# Altium footprint library 04.连接器件.pcb.PCBLIB: 363 footprints (part 22 of 23)
Each footprint in its own frame and in the unit in brackets; x right, y up, seen from the top. Pads: shape width x height; smd on the part's side, far side on the other; paste and mask are expansions set on the pad; w line width, h text height; cw(c..) or ccw(c..) is an arc to the next point about the centre after c.
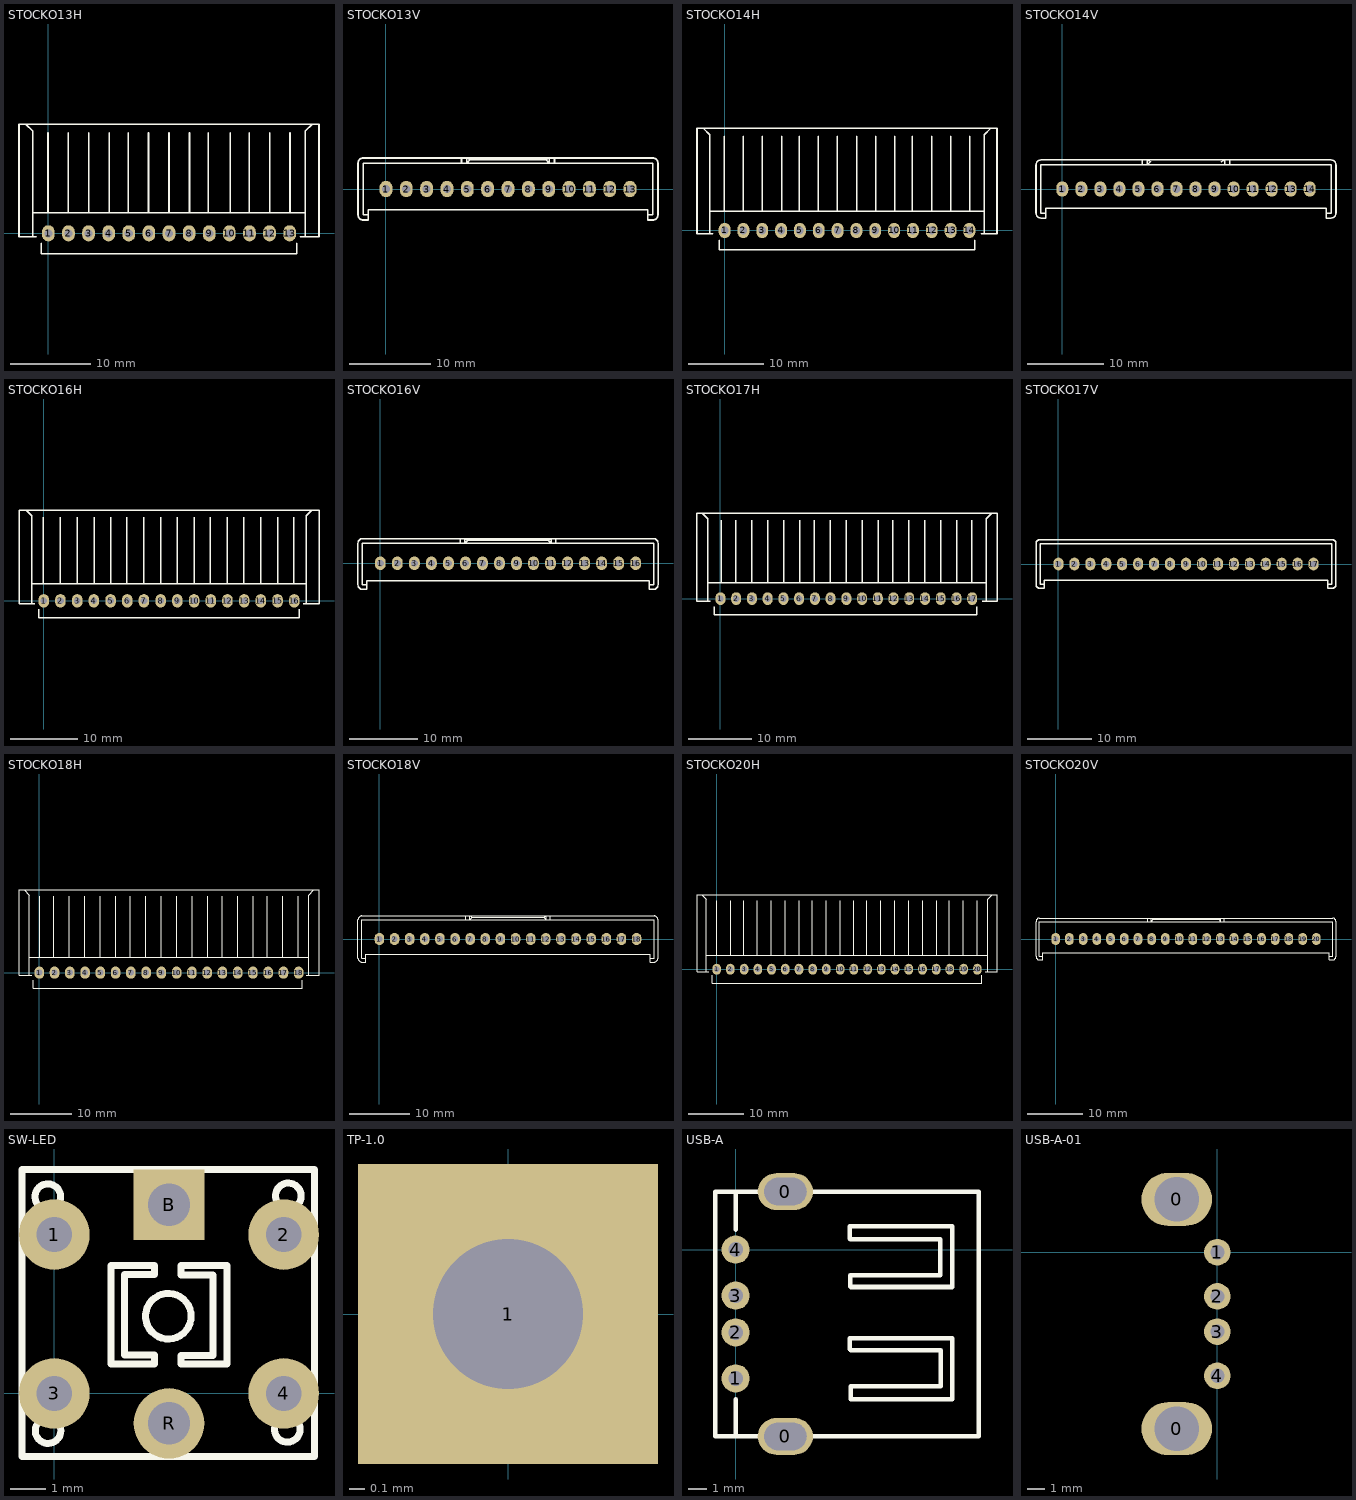
[diagram p21: the footprints below, top view; thin cyan lines are the x and y axes]

## STOCKO13H [mm]
pads (13):
  oval 1.575x2 hole 1: 1(0,0) 2(2.498,0) 3(4.995,0) 4(7.493,0) 5(9.991,0) 6(12.488,0) 7(14.986,0) 8(17.484,0) 9(19.981,0) 10(22.479,0) 11(24.977,0) 12(27.474,0) 13(29.972,0)
TopOverlay:
  lines w0.2: -2.794,13.547 -1.947,12.7 -1.947,-0.423 ; -1.947,2.54 31.919,2.54 ; -1.524,-0.423 -3.641,-0.423 -3.641,13.547 33.613,13.547 33.613,-0.423 31.284,-0.423 ; -0.889,-1.27 -0.889,-2.54 30.861,-2.54 30.861,-1.27 ; -0.042,2.54 -0.042,12.488 ; 2.498,2.54 2.498,12.488 ; 5.038,2.54 5.038,12.488 ; 7.578,2.54 7.578,12.488 ; 9.906,2.54 9.906,12.488 ; 12.446,2.54 12.446,12.488 ; 14.986,2.54 14.986,12.488 ; 17.526,2.54 17.526,12.488 ; 19.854,2.54 19.854,12.488 ; 22.606,2.54 22.606,12.488 ; 24.934,2.54 24.934,12.488 ; 27.474,2.54 27.474,12.488 ; 30.014,2.54 30.014,12.488 ; 31.919,-0.423 31.919,12.7 32.766,13.547

## STOCKO13V [mm]
pads (13):
  oval 1.575x2 hole 1: 1(0,0) 2(2.498,0) 3(4.995,0) 4(7.493,0) 5(9.991,0) 6(12.488,0) 7(14.986,0) 8(17.484,0) 9(19.981,0) 10(22.479,0) 11(24.977,0) 12(27.474,0) 13(29.972,0)
TopOverlay:
  lines w0.2: -2.159,-3.175 -2.794,-3.175 -2.794,3.175 32.766,3.175 32.766,-3.175 32.131,-3.175 ; 9.271,3.175 9.271,3.81 ; 20.701,3.175 20.701,3.81 ; 10.329,3.598 9.906,3.175 9.906,3.81 10.329,3.598 ; 10.329,3.598 19.643,3.598 ; 19.643,3.598 20.066,3.175 20.066,3.81 19.643,3.598 ; -3.429,-3.175 ccw(c-2.794,-3.175) -2.794,-3.81 -2.159,-3.81 -2.159,-2.54 32.131,-2.54 32.131,-3.81 32.766,-3.81 ccw(c32.766,-3.175) 33.401,-3.175 33.401,3.175 ccw(c32.766,3.175) 32.766,3.81 -2.794,3.81 ccw(c-2.794,3.175) -3.429,3.175 -3.429,-3.175

## STOCKO14H [mm]
pads (14):
  oval 1.575x2 hole 1: 1(0,0) 2(2.498,0) 3(4.995,0) 4(7.493,0) 5(9.991,0) 6(12.488,0) 7(14.986,0) 8(17.484,0) 9(19.981,0) 10(22.479,0) 11(24.977,0) 12(27.474,0) 13(29.972,0) 14(32.47,0)
TopOverlay:
  lines w0.2: -2.815,13.547 -1.968,12.7 -1.968,-0.423 ; -1.968,2.54 34.438,2.54 ; -1.545,-0.423 -3.662,-0.423 -3.662,13.547 36.131,13.547 36.131,-0.423 34.015,-0.423 ; -0.699,-1.27 -0.699,-2.54 33.168,-2.54 33.168,-1.27 ; -0.064,2.54 -0.064,12.488 ; 2.476,2.54 2.476,12.488 ; 5.016,2.54 5.016,12.488 ; 7.556,2.54 7.556,12.488 ; 9.885,2.54 9.885,12.488 ; 12.425,2.54 12.425,12.488 ; 14.965,2.54 14.965,12.488 ; 17.505,2.54 17.505,12.488 ; 20.045,2.54 20.045,12.488 ; 22.585,2.54 22.585,12.488 ; 24.913,2.54 24.913,12.488 ; 27.453,2.54 27.453,12.488 ; 29.993,2.54 29.993,12.488 ; 32.533,2.54 32.533,12.488 ; 34.438,-0.423 34.438,12.7 35.285,13.547

## STOCKO14V [mm]
pads (14):
  oval 1.575x2 hole 1: 1(0,0) 2(2.498,0) 3(4.995,0) 4(7.493,0) 5(9.991,0) 6(12.488,0) 7(14.986,0) 8(17.484,0) 9(19.981,0) 10(22.479,0) 11(24.977,0) 12(27.474,0) 13(29.972,0) 14(32.47,0)
TopOverlay:
  lines w0.2: -2.18,-3.175 -2.815,-3.175 -2.815,3.175 35.285,3.175 35.285,-3.175 34.65,-3.175 ; 10.52,3.175 10.52,3.81 ; 20.891,3.598 21.315,3.81 21.315,3.175 ; 21.95,3.175 21.95,3.81 ; -3.45,-3.175 ccw(c-2.815,-3.175) -2.815,-3.81 -2.18,-3.81 -2.18,-2.54 34.65,-2.54 34.65,-3.81 35.285,-3.81 ccw(c35.285,-3.175) 35.92,-3.175 35.92,3.175 ccw(c35.285,3.175) 35.285,3.81 -2.815,3.81 ccw(c-2.815,3.175) -3.45,3.175 -3.45,-3.175 ; 11.155,3.175 11.578,3.598 11.155,3.81 11.155,3.175

## STOCKO16H [mm]
pads (16):
  oval 1.575x2 hole 1: 1(0,0) 2(2.498,0) 3(4.995,0) 4(7.493,0) 5(9.991,0) 6(12.488,0) 7(14.986,0) 8(17.484,0) 9(19.981,0) 10(22.479,0) 11(24.977,0) 12(27.474,0) 13(29.972,0) 14(32.47,0) 15(34.967,0) 16(37.465,0)
TopOverlay:
  lines w0.2: -2.646,13.547 -1.799,12.7 -1.799,-0.423 ; -1.799,2.54 39.264,2.54 ; -1.376,-0.423 -3.704,-0.423 -3.704,13.547 41.169,13.547 41.169,-0.423 38.841,-0.423 ; -0.741,-1.27 -0.741,-2.54 38.206,-2.54 38.206,-1.27 ; -0.106,2.54 -0.106,12.488 ; 2.434,2.54 2.434,12.488 ; 4.974,2.54 4.974,12.488 ; 7.514,2.54 7.514,12.488 ; 10.054,2.54 10.054,12.488 ; 12.383,2.54 12.383,12.488 ; 14.922,2.54 14.922,12.488 ; 17.462,2.54 17.462,12.488 ; 20.002,2.54 20.002,12.488 ; 22.543,2.54 22.543,12.488 ; 24.871,2.54 24.871,12.488 ; 27.411,2.54 27.411,12.488 ; 29.951,2.54 29.951,12.488 ; 32.491,2.54 32.491,12.488 ; 35.031,2.54 35.031,12.488 ; 37.359,2.54 37.359,12.488 ; 39.264,-0.423 39.264,12.7 40.111,13.547

## STOCKO16V [mm]
pads (16):
  oval 1.575x2 hole 1: 1(0,0) 2(2.498,0) 3(4.995,0) 4(7.493,0) 5(9.991,0) 6(12.488,0) 7(14.986,0) 8(17.484,0) 9(19.981,0) 10(22.479,0) 11(24.977,0) 12(27.474,0) 13(29.972,0) 14(32.47,0) 15(34.967,0) 16(37.465,0)
TopOverlay:
  lines w0.2: -2.011,-3.175 -2.646,-3.175 -2.646,2.963 40.111,2.963 40.111,-3.175 39.476,-3.175 ; 11.747,2.963 11.747,3.598 ; 25.717,2.963 25.717,3.598 ; 12.806,3.387 12.383,2.963 12.383,3.598 12.806,3.387 ; 12.806,3.387 24.659,3.387 ; 24.659,3.387 25.082,2.963 25.082,3.598 24.659,3.387 ; -3.281,-3.175 ccw(c-2.646,-3.175) -2.646,-3.81 -2.011,-3.81 -2.011,-2.54 39.476,-2.54 39.476,-3.81 40.111,-3.81 ccw(c40.111,-3.175) 40.746,-3.175 40.746,2.963 ccw(c40.111,2.963) 40.111,3.598 -2.646,3.598 ccw(c-2.646,2.963) -3.281,2.963 -3.281,-3.175

## STOCKO17H [mm]
pads (17):
  oval 1.575x2 hole 1: 1(0,0) 2(2.498,0) 3(4.995,0) 4(7.493,0) 5(9.991,0) 6(12.488,0) 7(14.986,0) 8(17.484,0) 9(19.981,0) 10(22.479,0) 11(24.977,0) 12(27.474,0) 13(29.972,0) 14(32.47,0) 15(34.967,0) 16(37.465,0) 17(39.963,0)
TopOverlay:
  lines w0.2: -2.879,13.547 -2.032,12.7 -2.032,-0.423 ; -2.032,2.54 42.206,2.54 ; -1.609,-0.423 -3.725,-0.423 -3.725,13.547 43.9,13.547 43.9,-0.423 41.571,-0.423 ; -0.974,-1.27 -0.974,-2.54 40.725,-2.54 40.725,-1.27 ; 0.085,2.54 0.085,12.488 ; 2.413,2.54 2.413,12.488 ; 4.953,2.54 4.953,12.488 ; 7.493,2.54 7.493,12.488 ; 10.033,2.54 10.033,12.488 ; 12.573,2.54 12.573,12.488 ; 14.901,2.54 14.901,12.488 ; 17.441,2.54 17.441,12.488 ; 19.981,2.54 19.981,12.488 ; 22.521,2.54 22.521,12.488 ; 25.061,2.54 25.061,12.488 ; 27.39,2.54 27.39,12.488 ; 29.93,2.54 29.93,12.488 ; 32.47,2.54 32.47,12.488 ; 35.01,2.54 35.01,12.488 ; 37.55,2.54 37.55,12.488 ; 39.878,2.54 39.878,12.488 ; 42.206,-0.423 42.206,12.7 43.053,13.547

## STOCKO17V [mm]
pads (17):
  oval 1.575x2 hole 1: 1(0,0) 2(2.498,0) 3(4.995,0) 4(7.493,0) 5(9.991,0) 6(12.488,0) 7(14.986,0) 8(17.484,0) 9(19.981,0) 10(22.479,0) 11(24.977,0) 12(27.474,0) 13(29.972,0) 14(32.47,0) 15(34.967,0) 16(37.465,0) 17(39.963,0)
TopOverlay:
  lines w0.2: -2.244,-3.175 -2.879,-3.175 -2.879,3.175 42.841,3.175 42.841,-3.175 42.206,-3.175 ; -3.514,-3.175 ccw(c-2.879,-3.175) -2.879,-3.81 -2.244,-3.81 -2.244,-2.54 42.206,-2.54 42.206,-3.81 42.841,-3.81 ccw(c42.841,-3.175) 43.476,-3.175 43.476,3.175 ccw(c42.841,3.175) 42.841,3.81 -2.879,3.81 ccw(c-2.879,3.175) -3.514,3.175 -3.514,-3.175

## STOCKO18H [mm]
pads (18):
  oval 1.575x2 hole 1: 1(0,0) 2(2.498,0) 3(4.995,0) 4(7.493,0) 5(9.991,0) 6(12.488,0) 7(14.986,0) 8(17.484,0) 9(19.981,0) 10(22.479,0) 11(24.977,0) 12(27.474,0) 13(29.972,0) 14(32.47,0) 15(34.967,0) 16(37.465,0) 17(39.963,0) 18(42.46,0)
TopOverlay:
  lines w0.2: -2.476,13.547 -1.63,12.7 -1.63,-0.423 ; -1.63,2.54 44.09,2.54 ; -1.206,-0.423 -3.323,-0.423 -3.323,13.547 45.783,13.547 45.783,-0.423 43.667,-0.423 ; -0.995,-1.27 -0.995,-2.54 43.032,-2.54 43.032,-1.27 ; 0.064,2.54 0.064,12.488 ; 2.392,2.54 2.392,12.488 ; 4.932,2.54 4.932,12.488 ; 7.472,2.54 7.472,12.488 ; 10.012,2.54 10.012,12.488 ; 12.552,2.54 12.552,12.488 ; 14.88,2.54 14.88,12.488 ; 17.42,2.54 17.42,12.488 ; 19.96,2.54 19.96,12.488 ; 22.5,2.54 22.5,12.488 ; 25.04,2.54 25.04,12.488 ; 27.58,2.54 27.58,12.488 ; 29.908,2.54 29.908,12.488 ; 32.448,2.54 32.448,12.488 ; 34.988,2.54 34.988,12.488 ; 37.317,2.54 37.317,12.488 ; 39.857,2.54 39.857,12.488 ; 42.397,2.54 42.397,12.488 ; 44.09,-0.423 44.09,12.7 44.937,13.547

## STOCKO18V [mm]
pads (18):
  oval 1.575x2 hole 1: 1(0,0) 2(2.498,0) 3(4.995,0) 4(7.493,0) 5(9.991,0) 6(12.488,0) 7(14.986,0) 8(17.484,0) 9(19.981,0) 10(22.479,0) 11(24.977,0) 12(27.474,0) 13(29.972,0) 14(32.47,0) 15(34.967,0) 16(37.465,0) 17(39.963,0) 18(42.46,0)
TopOverlay:
  lines w0.2: -2.265,-3.175 -2.9,-3.175 -2.9,3.175 45.36,3.175 45.36,-3.175 44.725,-3.175 ; 14.245,3.175 14.245,3.81 ; 28.215,3.175 28.215,3.81 ; 15.303,3.598 14.88,3.175 14.88,3.81 15.303,3.598 ; 15.303,3.598 27.157,3.598 ; 27.157,3.598 27.58,3.175 27.58,3.81 27.157,3.598 ; -3.535,-3.175 ccw(c-2.9,-3.175) -2.9,-3.81 -2.265,-3.81 -2.265,-2.54 44.725,-2.54 44.725,-3.81 45.36,-3.81 ccw(c45.36,-3.175) 45.995,-3.175 45.995,3.175 ccw(c45.36,3.175) 45.36,3.81 -2.9,3.81 ccw(c-2.9,3.175) -3.535,3.175 -3.535,-3.175

## STOCKO20H [mm]
pads (20):
  oval 1.575x2 hole 1: 1(0,0) 2(2.498,0) 3(4.995,0) 4(7.493,0) 5(9.991,0) 6(12.488,0) 7(14.986,0) 8(17.484,0) 9(19.981,0) 10(22.479,0) 11(24.977,0) 12(27.474,0) 13(29.972,0) 14(32.47,0) 15(34.967,0) 16(37.465,0) 17(39.963,0) 18(42.46,0) 19(44.958,0) 20(47.456,0)
TopOverlay:
  lines w0.2: -2.73,13.547 -1.884,12.7 -1.884,-0.423 ; -1.884,2.54 49.339,2.54 ; -1.46,-0.423 -3.577,-0.423 -3.577,13.547 51.033,13.547 51.033,-0.423 48.916,-0.423 ; -0.826,-1.058 -0.826,-2.54 48.281,-2.54 48.281,-1.058 ; 0.021,2.54 0.021,12.488 ; 2.561,2.54 2.561,12.488 ; 4.889,2.54 4.889,12.488 ; 7.429,2.54 7.429,12.488 ; 9.97,2.54 9.97,12.488 ; 12.509,2.54 12.509,12.488 ; 15.05,2.54 15.05,12.488 ; 17.378,2.54 17.378,12.488 ; 19.918,2.54 19.918,12.488 ; 22.458,2.54 22.458,12.488 ; 24.998,2.54 24.998,12.488 ; 27.326,2.54 27.326,12.488 ; 29.866,2.54 29.866,12.488 ; 32.406,2.54 32.406,12.488 ; 34.946,2.54 34.946,12.488 ; 37.486,2.54 37.486,12.488 ; 40.026,2.54 40.026,12.488 ; 42.354,2.54 42.354,12.488 ; 44.894,2.54 44.894,12.488 ; 47.434,2.54 47.434,12.488 ; 49.339,-0.423 49.339,12.7 50.186,13.547

## STOCKO20V [mm]
pads (20):
  oval 1.575x2.2 hole 1: 1(0,0) 2(2.498,0) 3(4.995,0) 4(7.493,0) 5(9.991,0) 6(12.488,0) 7(14.986,0) 8(17.484,0) 9(19.981,0) 10(22.479,0) 11(24.977,0) 12(27.474,0) 13(29.972,0) 14(32.47,0) 15(34.967,0) 16(37.465,0) 17(39.963,0) 18(42.46,0) 19(44.958,0) 20(47.456,0)
TopOverlay:
  lines w0.2: -2.307,-3.175 -2.942,-3.175 -2.942,3.175 -2.73,3.175 50.398,3.175 50.398,-3.175 49.763,-3.175 ; 16.743,3.175 16.743,3.81 ; 30.713,3.175 30.713,3.81 ; 17.801,3.598 17.378,3.175 17.378,3.81 17.801,3.598 ; 17.801,3.598 29.654,3.598 ; 29.654,3.598 30.078,3.175 30.078,3.81 29.654,3.598 ; -3.577,-3.175 ccw(c-2.942,-3.175) -2.942,-3.81 -2.307,-3.81 -2.307,-2.54 49.763,-2.54 49.763,-3.81 50.398,-3.81 ccw(c50.398,-3.175) 51.033,-3.175 51.033,3.175 ccw(c50.398,3.175) 50.398,3.81 -2.942,3.81 ccw(c-2.942,3.175) -3.577,3.175 -3.577,-3.175

## SW-LED [mm]
pads (6):
  round 2 hole 1: 1(0,4.5) 2(6.5,4.5) 3(0,0) 4(6.5,0)
  rect 2x2 hole 1.2: B(3.25,5.35)
  round 2 hole 1.2: R(3.25,-0.85)
TopOverlay:
  circle w0.2: c6.632,5.596 r0.363
  circle w0.2: c-0.184,5.573 r0.363
  circle w0.2: c-0.176,-1.054 r0.363
  circle w0.2: c6.602,-1.017 r0.363
  circle w0.2: c3.231,2.188 r0.645
  lines w0.2: 1.603,3.629 1.603,0.837 2.841,0.837 2.841,1.092 1.989,1.092 1.989,1.967 1.989,3.367 2.841,3.367 2.841,3.629 1.603,3.629 ; 1.603,3.629 1.603,3.629 ; -0.919,-1.79 7.367,-1.79 7.367,6.346 -0.919,6.346 -0.919,2.413 -0.919,-1.79 ; 3.584,0.837 4.89,0.837 4.89,3.629 3.584,3.629 3.584,3.359 4.496,3.359 4.496,2.447 4.496,1.991 4.496,1.079 3.584,1.079 3.584,0.837

## TP-1.0 [mm]
pads (1):
  rect 2x2 hole 1: 1(0,0)

## USB-A [mm]
pads (6):
  oval 3x2 hole 1.5 slot 2.3 at 0 deg: 0(2.7,-10.15) 0(2.7,3.15)
  round 1.524 hole 0.8: 1(0,-7) 2(0,-4.5) 3(0,-2.5) 4(0,0)
TopOverlay:
  lines w0.254: 0,-10.15 0,-8.128 ; 0,1.093 0,3.15 ; 6.198,-5.41 6.198,-4.826 11.76,-4.826 11.76,-8.128 6.248,-8.128 6.248,-7.417 11.151,-7.417 11.151,-5.461 6.248,-5.461 ; 6.198,0.584 6.198,1.27 11.76,1.27 11.76,-2.032 6.248,-2.032 ; 6.223,-2.007 6.223,-1.397 11.125,-1.397 11.125,0.559 6.223,0.559 ; -1.1,-10.15 13.2,-10.15 13.2,3.15 -1.1,3.15 -1.1,-10.15
3D body "Samtec-USBR-A-S-S-O-TH.STEP": height 7.55, standoff -3.3, extent -1.1,-11.405 13.06,4.395

## USB-A-01 [mm]
pads (6):
  oval 4x3 hole 2.5: 0(-2.3,-10) 0(-2.3,3)
  round 1.5 hole 0.8: 1(0,0) 2(0,-2.5) 3(0,-4.5) 4(0,-7)